# Altium footprint library ref-packages-longpad.PCBLIB: 1527 footprints (part 98 of 103)
Each footprint in its own frame and in the unit in brackets; x right, y up, seen from the top. Pads: shape width x height; smd on the part's side, far side on the other; paste and mask are expansions set on the pad; w line width, h text height; cw(c..) or ccw(c..) is an arc to the next point about the centre after c.
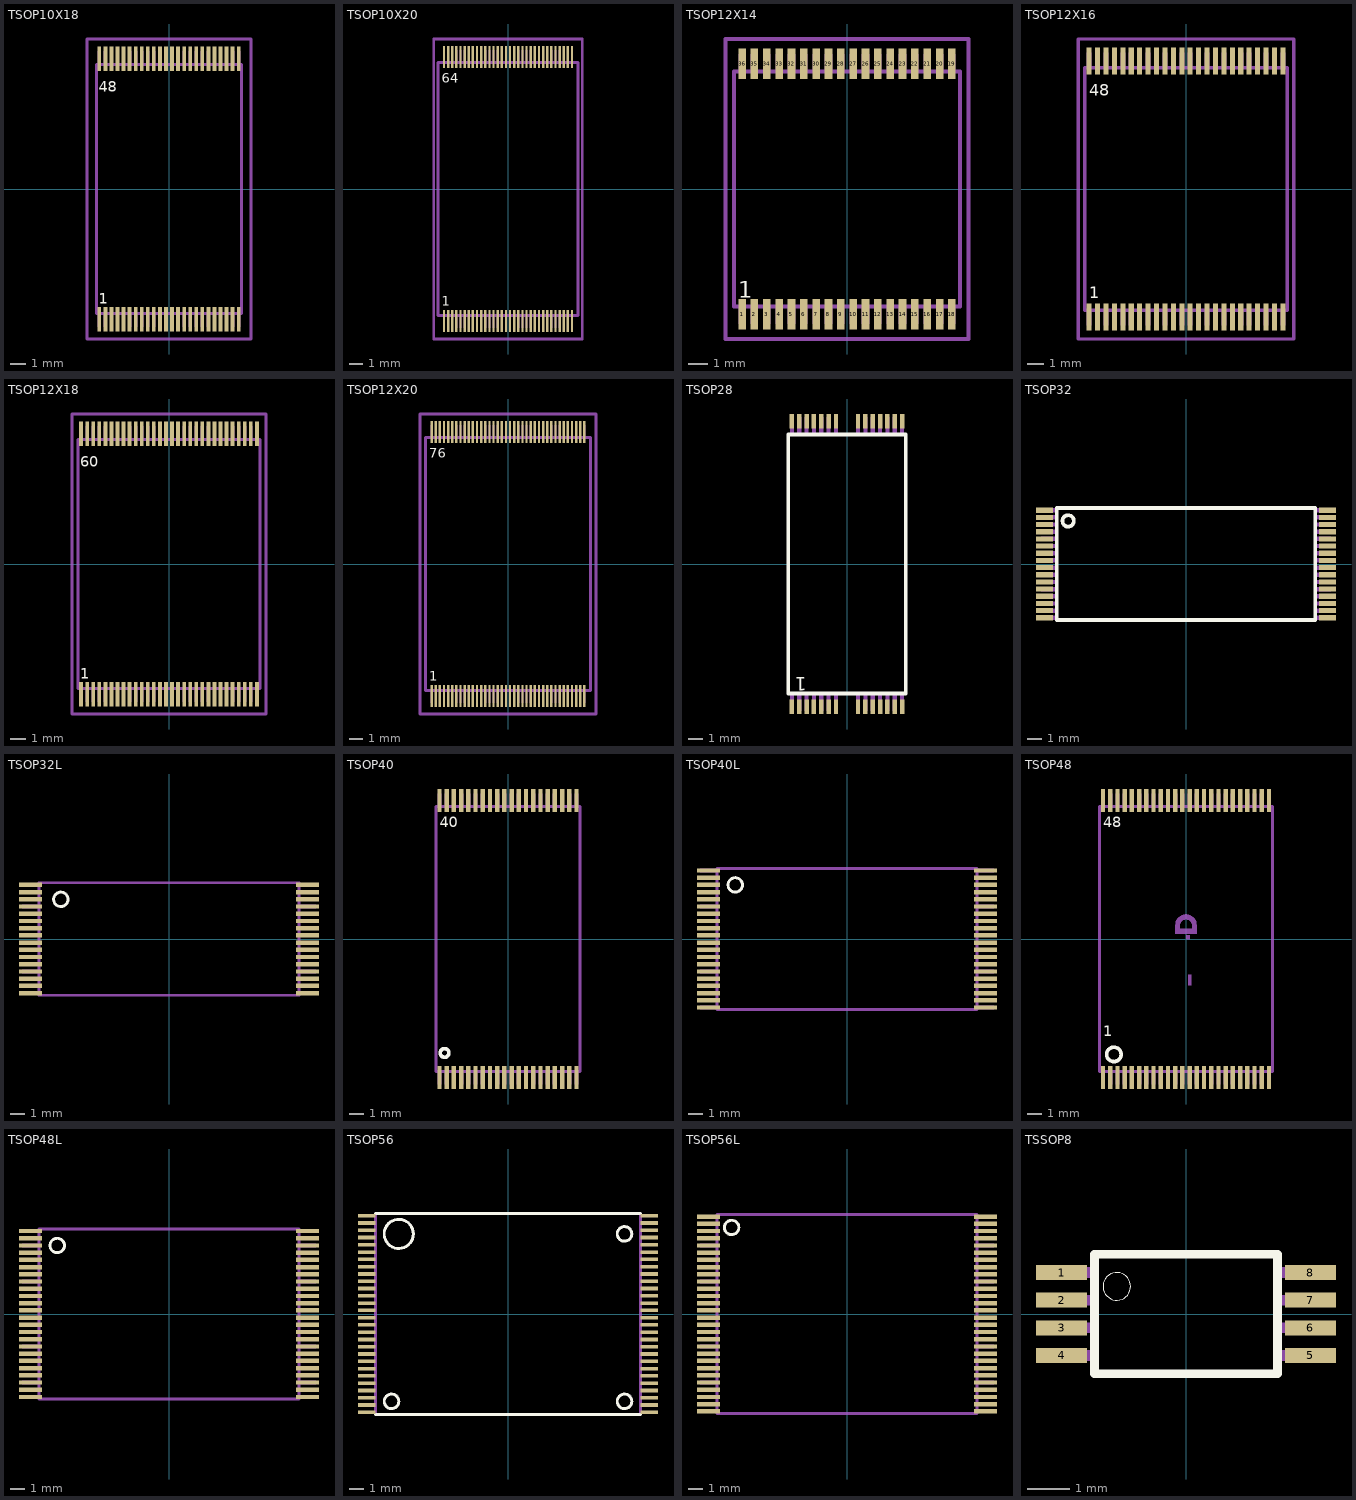
[diagram p97: the footprints below, top view; thin cyan lines are the x and y axes]

## TSOP10X18 [mm]
pads (48):
  rect 0.25x1.6 smd: 1(-4.6,-8.6) 2(-4.2,-8.6) 3(-3.8,-8.6) 4(-3.4,-8.6) 5(-3,-8.6) 6(-2.6,-8.6) 7(-2.2,-8.6) 8(-1.8,-8.6) 9(-1.4,-8.6) 10(-1,-8.6) 11(-0.6,-8.6) 12(-0.2,-8.6) 13(0.2,-8.6) 14(0.6,-8.6) 15(1,-8.6) 16(1.4,-8.6) 17(1.8,-8.6) 18(2.2,-8.6) 19(2.6,-8.6) 20(3,-8.6) 21(3.4,-8.6) 22(3.8,-8.6) 23(4.2,-8.6) 24(4.6,-8.6) 25(4.6,8.6) 26(4.2,8.6) 27(3.8,8.6) 28(3.4,8.6) 29(3,8.6) 30(2.6,8.6) 31(2.2,8.6) 32(1.8,8.6) 33(1.4,8.6) 34(1,8.6) 35(0.6,8.6) 36(0.2,8.6) 37(-0.2,8.6) 38(-0.6,8.6) 39(-1,8.6) 40(-1.4,8.6) 41(-1.8,8.6) 42(-2.2,8.6) 43(-2.6,8.6) 44(-3,8.6) 45(-3.4,8.6) 46(-3.8,8.6) 47(-4.2,8.6) 48(-4.6,8.6)
Top Overlay:
  text "1" at -4.651,-7.57 h0.69
  text "48" at -4.651,6.43 h0.69
Mechanical 16:
  rectangle: -4.71,-9.1 -4.49,-8.27
  rectangle: -4.31,-9.1 -4.09,-8.27
  rectangle: -3.91,-9.1 -3.69,-8.27
  rectangle: -3.51,-9.1 -3.29,-8.27
  rectangle: -3.11,-9.1 -2.89,-8.27
  rectangle: -2.71,-9.1 -2.49,-8.27
  rectangle: -2.31,-9.1 -2.09,-8.27
  rectangle: -1.91,-9.1 -1.69,-8.27
  rectangle: -1.51,-9.1 -1.29,-8.27
  rectangle: -1.11,-9.1 -0.89,-8.27
  rectangle: -0.71,-9.1 -0.49,-8.27
  rectangle: -0.31,-9.1 -0.09,-8.27
  rectangle: 0.09,-9.1 0.31,-8.27
  rectangle: 0.49,-9.1 0.71,-8.27
  rectangle: 0.89,-9.1 1.11,-8.27
  rectangle: 1.29,-9.1 1.51,-8.27
  rectangle: 1.69,-9.1 1.91,-8.27
  rectangle: 2.09,-9.1 2.31,-8.27
  rectangle: 2.49,-9.1 2.71,-8.27
  rectangle: 2.89,-9.1 3.11,-8.27
  rectangle: 3.29,-9.1 3.51,-8.27
  rectangle: 3.69,-9.1 3.91,-8.27
  rectangle: 4.09,-9.1 4.31,-8.27
  rectangle: 4.49,-9.1 4.71,-8.27
  rectangle: 4.49,8.27 4.71,9.1
  rectangle: 4.09,8.27 4.31,9.1
  rectangle: 3.69,8.27 3.91,9.1
  rectangle: 3.29,8.27 3.51,9.1
  rectangle: 2.89,8.27 3.11,9.1
  rectangle: 2.49,8.27 2.71,9.1
  rectangle: 2.09,8.27 2.31,9.1
  rectangle: 1.69,8.27 1.91,9.1
  rectangle: 1.29,8.27 1.51,9.1
  rectangle: 0.89,8.27 1.11,9.1
  rectangle: 0.49,8.27 0.71,9.1
  rectangle: 0.09,8.27 0.31,9.1
  rectangle: -0.31,8.27 -0.09,9.1
  rectangle: -0.71,8.27 -0.49,9.1
  rectangle: -1.11,8.27 -0.89,9.1
  rectangle: -1.51,8.27 -1.29,9.1
  rectangle: -1.91,8.27 -1.69,9.1
  rectangle: -2.31,8.27 -2.09,9.1
  rectangle: -2.71,8.27 -2.49,9.1
  rectangle: -3.11,8.27 -2.89,9.1
  rectangle: -3.51,8.27 -3.29,9.1
  rectangle: -3.91,8.27 -3.69,9.1
  rectangle: -4.31,8.27 -4.09,9.1
  rectangle: -4.71,8.27 -4.49,9.1
  lines w0.203: -4.795,-8.205 4.795,-8.205 4.795,8.205 -4.795,8.205 -4.795,-8.205
Mechanical 27:
  lines w0.2: -5.4,-9.9 -5.4,9.9 5.4,9.9 5.4,-9.9 -5.4,-9.9

## TSOP10X20 [mm]
pads (64):
  rect 0.17x1.6 smd: 1(-4.65,-9.6) 2(-4.35,-9.6) 3(-4.05,-9.6) 4(-3.75,-9.6) 5(-3.45,-9.6) 6(-3.15,-9.6) 7(-2.85,-9.6) 8(-2.55,-9.6) 9(-2.25,-9.6) 10(-1.95,-9.6) 11(-1.65,-9.6) 12(-1.35,-9.6) 13(-1.05,-9.6) 14(-0.75,-9.6) 15(-0.45,-9.6) 16(-0.15,-9.6) 17(0.15,-9.6) 18(0.45,-9.6) 19(0.75,-9.6) 20(1.05,-9.6) 21(1.35,-9.6) 22(1.65,-9.6) 23(1.95,-9.6) 24(2.25,-9.6) 25(2.55,-9.6) 26(2.85,-9.6) 27(3.15,-9.6) 28(3.45,-9.6) 29(3.75,-9.6) 30(4.05,-9.6) 31(4.35,-9.6) 32(4.65,-9.6) 33(4.65,9.6) 34(4.35,9.6) 35(4.05,9.6) 36(3.75,9.6) 37(3.45,9.6) 38(3.15,9.6) 39(2.85,9.6) 40(2.55,9.6) 41(2.25,9.6) 42(1.95,9.6) 43(1.65,9.6) 44(1.35,9.6) 45(1.05,9.6) 46(0.75,9.6) 47(0.45,9.6) 48(0.15,9.6) 49(-0.15,9.6) 50(-0.45,9.6) 51(-0.75,9.6) 52(-1.05,9.6) 53(-1.35,9.6) 54(-1.65,9.6) 55(-1.95,9.6) 56(-2.25,9.6) 57(-2.55,9.6) 58(-2.85,9.6) 59(-3.15,9.6) 60(-3.45,9.6) 61(-3.75,9.6) 62(-4.05,9.6) 63(-4.35,9.6) 64(-4.65,9.6)
Top Overlay:
  text "1" at -4.831,-8.48 h0.69
  text "64" at -4.831,7.72 h0.69
Mechanical 16:
  rectangle: -4.72,-10.1 -4.58,-9.25
  rectangle: -4.42,-10.1 -4.28,-9.25
  rectangle: -4.12,-10.1 -3.98,-9.25
  rectangle: -3.82,-10.1 -3.68,-9.25
  rectangle: -3.52,-10.1 -3.38,-9.25
  rectangle: -3.22,-10.1 -3.08,-9.25
  rectangle: -2.92,-10.1 -2.78,-9.25
  rectangle: -2.62,-10.1 -2.48,-9.25
  rectangle: -2.32,-10.1 -2.18,-9.25
  rectangle: -2.02,-10.1 -1.88,-9.25
  rectangle: -1.72,-10.1 -1.58,-9.25
  rectangle: -1.42,-10.1 -1.28,-9.25
  rectangle: -1.12,-10.1 -0.98,-9.25
  rectangle: -0.82,-10.1 -0.68,-9.25
  rectangle: -0.52,-10.1 -0.38,-9.25
  rectangle: -0.22,-10.1 -0.08,-9.25
  rectangle: 0.08,-10.1 0.22,-9.25
  rectangle: 0.38,-10.1 0.52,-9.25
  rectangle: 0.68,-10.1 0.82,-9.25
  rectangle: 0.98,-10.1 1.12,-9.25
  rectangle: 1.28,-10.1 1.42,-9.25
  rectangle: 1.58,-10.1 1.72,-9.25
  rectangle: 1.88,-10.1 2.02,-9.25
  rectangle: 2.18,-10.1 2.32,-9.25
  rectangle: 2.48,-10.1 2.62,-9.25
  rectangle: 2.78,-10.1 2.92,-9.25
  rectangle: 3.08,-10.1 3.22,-9.25
  rectangle: 3.38,-10.1 3.52,-9.25
  rectangle: 3.68,-10.1 3.82,-9.25
  rectangle: 3.98,-10.1 4.12,-9.25
  rectangle: 4.28,-10.1 4.42,-9.25
  rectangle: 4.58,-10.1 4.72,-9.25
  rectangle: 4.58,9.25 4.72,10.1
  rectangle: 4.28,9.25 4.42,10.1
  rectangle: 3.98,9.25 4.12,10.1
  rectangle: 3.68,9.25 3.82,10.1
  rectangle: 3.38,9.25 3.52,10.1
  rectangle: 3.08,9.25 3.22,10.1
  rectangle: 2.78,9.25 2.92,10.1
  rectangle: 2.48,9.25 2.62,10.1
  rectangle: 2.18,9.25 2.32,10.1
  rectangle: 1.88,9.25 2.02,10.1
  rectangle: 1.58,9.25 1.72,10.1
  rectangle: 1.28,9.25 1.42,10.1
  rectangle: 0.98,9.25 1.12,10.1
  rectangle: 0.68,9.25 0.82,10.1
  rectangle: 0.38,9.25 0.52,10.1
  rectangle: 0.08,9.25 0.22,10.1
  rectangle: -0.22,9.25 -0.08,10.1
  rectangle: -0.52,9.25 -0.38,10.1
  rectangle: -0.82,9.25 -0.68,10.1
  rectangle: -1.12,9.25 -0.98,10.1
  rectangle: -1.42,9.25 -1.28,10.1
  rectangle: -1.72,9.25 -1.58,10.1
  rectangle: -2.02,9.25 -1.88,10.1
  rectangle: -2.32,9.25 -2.18,10.1
  rectangle: -2.62,9.25 -2.48,10.1
  rectangle: -2.92,9.25 -2.78,10.1
  rectangle: -3.22,9.25 -3.08,10.1
  rectangle: -3.52,9.25 -3.38,10.1
  rectangle: -3.82,9.25 -3.68,10.1
  rectangle: -4.12,9.25 -3.98,10.1
  rectangle: -4.42,9.25 -4.28,10.1
  rectangle: -4.72,9.25 -4.58,10.1
  lines w0.203: -5.095,-9.195 5.095,-9.195 5.095,9.195 -5.095,9.195 -5.095,-9.195
Mechanical 27:
  lines w0.2: -5.4,-10.9 -5.4,10.9 5.4,10.9 5.4,-10.9 -5.4,-10.9

## TSOP12X14 [mm]
pads (36):
  rect 0.4x1.6 smd: 1(-5.525,-6.6) 2(-4.875,-6.6) 3(-4.225,-6.6) 4(-3.575,-6.6) 5(-2.925,-6.6) 6(-2.275,-6.6) 7(-1.625,-6.6) 8(-0.975,-6.6) 9(-0.325,-6.6) 10(0.325,-6.6) 11(0.975,-6.6) 12(1.625,-6.6) 13(2.275,-6.6) 14(2.925,-6.6) 15(3.575,-6.6) 16(4.225,-6.6) 17(4.875,-6.6) 18(5.525,-6.6) 19(5.525,6.6) 20(4.875,6.6) 21(4.225,6.6) 22(3.575,6.6) 23(2.925,6.6) 24(2.275,6.6) 25(1.625,6.6) 26(0.975,6.6) 27(0.325,6.6) 28(-0.325,6.6) 29(-0.975,6.6) 30(-1.625,6.6) 31(-2.275,6.6) 32(-2.925,6.6) 33(-3.575,6.6) 34(-4.225,6.6) 35(-4.875,6.6) 36(-5.525,6.6)
Top Overlay:
  text "1" at -5.731,-5.73 h0.86
Mechanical 16:
  rectangle: -5.725,-7.1 -5.325,-6.28
  rectangle: -5.075,-7.1 -4.675,-6.28
  rectangle: -4.425,-7.1 -4.025,-6.28
  rectangle: -3.775,-7.1 -3.375,-6.28
  rectangle: -3.125,-7.1 -2.725,-6.28
  rectangle: -2.475,-7.1 -2.075,-6.28
  rectangle: -1.825,-7.1 -1.425,-6.28
  rectangle: -1.175,-7.1 -0.775,-6.28
  rectangle: -0.525,-7.1 -0.125,-6.28
  rectangle: 0.125,-7.1 0.525,-6.28
  rectangle: 0.775,-7.1 1.175,-6.28
  rectangle: 1.425,-7.1 1.825,-6.28
  rectangle: 2.075,-7.1 2.475,-6.28
  rectangle: 2.725,-7.1 3.125,-6.28
  rectangle: 3.375,-7.1 3.775,-6.28
  rectangle: 4.025,-7.1 4.425,-6.28
  rectangle: 4.675,-7.1 5.075,-6.28
  rectangle: 5.325,-7.1 5.725,-6.28
  rectangle: 5.325,6.28 5.725,7.1
  rectangle: 4.675,6.28 5.075,7.1
  rectangle: 4.025,6.28 4.425,7.1
  rectangle: 3.375,6.28 3.775,7.1
  rectangle: 2.725,6.28 3.125,7.1
  rectangle: 2.075,6.28 2.475,7.1
  rectangle: 1.425,6.28 1.825,7.1
  rectangle: 0.775,6.28 1.175,7.1
  rectangle: 0.125,6.28 0.525,7.1
  rectangle: -0.525,6.28 -0.125,7.1
  rectangle: -1.175,6.28 -0.775,7.1
  rectangle: -1.825,6.28 -1.425,7.1
  rectangle: -2.475,6.28 -2.075,7.1
  rectangle: -3.125,6.28 -2.725,7.1
  rectangle: -3.775,6.28 -3.375,7.1
  rectangle: -4.425,6.28 -4.025,7.1
  rectangle: -5.075,6.28 -4.675,7.1
  rectangle: -5.725,6.28 -5.325,7.1
  lines w0.203: -5.945,-6.195 5.945,-6.195 5.945,6.195 -5.945,6.195 -5.945,-6.195
Mechanical 27:
  lines w0.2: -6.4,-7.9 -6.4,7.9 6.4,7.9 6.4,-7.9 -6.4,-7.9

## TSOP12X16 [mil]
pads (48):
  rect 11.81x62.99 smd: 1(-226.38,-299.21) 2(-206.69,-299.21) 3(-187.01,-299.21) 4(-167.32,-299.21) 5(-147.64,-299.21) 6(-127.95,-299.21) 7(-108.27,-299.21) 8(-88.58,-299.21) 9(-68.9,-299.21) 10(-49.21,-299.21) 11(-29.53,-299.21) 12(-9.84,-299.21) 13(9.84,-299.21) 14(29.53,-299.21) 15(49.21,-299.21) 16(68.9,-299.21) 17(88.58,-299.21) 18(108.27,-299.21) 19(127.95,-299.21) 20(147.64,-299.21) 21(167.32,-299.21) 22(187.01,-299.21) 23(206.69,-299.21) 24(226.38,-299.21) 25(226.38,299.21) 26(206.69,299.21) 27(187.01,299.21) 28(167.32,299.21) 29(147.64,299.21) 30(127.95,299.21) 31(108.27,299.21) 32(88.58,299.21) 33(68.9,299.21) 34(49.21,299.21) 35(29.53,299.21) 36(9.84,299.21) 37(-9.84,299.21) 38(-29.53,299.21) 39(-49.21,299.21) 40(-68.9,299.21) 41(-88.58,299.21) 42(-108.27,299.21) 43(-127.95,299.21) 44(-147.64,299.21) 45(-167.32,299.21) 46(-187.01,299.21) 47(-206.69,299.21) 48(-226.38,299.21)
Top Overlay:
  text "1" at -225.64,-255.12 h27.2
  text "48" at -225.64,217.32 h27.2
Mechanical 16:
  rectangle: -232.28,-318.9 -220.47,-285.43
  rectangle: -212.6,-318.9 -200.79,-285.43
  rectangle: -192.91,-318.9 -181.1,-285.43
  rectangle: -173.23,-318.9 -161.42,-285.43
  rectangle: -153.54,-318.9 -141.73,-285.43
  rectangle: -133.86,-318.9 -122.05,-285.43
  rectangle: -114.17,-318.9 -102.36,-285.43
  rectangle: -94.49,-318.9 -82.68,-285.43
  rectangle: -74.8,-318.9 -62.99,-285.43
  rectangle: -55.12,-318.9 -43.31,-285.43
  rectangle: -35.43,-318.9 -23.62,-285.43
  rectangle: -15.75,-318.9 -3.94,-285.43
  rectangle: 3.94,-318.9 15.75,-285.43
  rectangle: 23.62,-318.9 35.43,-285.43
  rectangle: 43.31,-318.9 55.12,-285.43
  rectangle: 62.99,-318.9 74.8,-285.43
  rectangle: 82.68,-318.9 94.49,-285.43
  rectangle: 102.36,-318.9 114.17,-285.43
  rectangle: 122.05,-318.9 133.86,-285.43
  rectangle: 141.73,-318.9 153.54,-285.43
  rectangle: 161.42,-318.9 173.23,-285.43
  rectangle: 181.1,-318.9 192.91,-285.43
  rectangle: 200.79,-318.9 212.6,-285.43
  rectangle: 220.47,-318.9 232.28,-285.43
  rectangle: 220.47,285.43 232.28,318.9
  rectangle: 200.79,285.43 212.6,318.9
  rectangle: 181.1,285.43 192.91,318.9
  rectangle: 161.42,285.43 173.23,318.9
  rectangle: 141.73,285.43 153.54,318.9
  rectangle: 122.05,285.43 133.86,318.9
  rectangle: 102.36,285.43 114.17,318.9
  rectangle: 82.68,285.43 94.49,318.9
  rectangle: 62.99,285.43 74.8,318.9
  rectangle: 43.31,285.43 55.12,318.9
  rectangle: 23.62,285.43 35.43,318.9
  rectangle: 3.94,285.43 15.75,318.9
  rectangle: -15.75,285.43 -3.94,318.9
  rectangle: -35.43,285.43 -23.62,318.9
  rectangle: -55.12,285.43 -43.31,318.9
  rectangle: -74.8,285.43 -62.99,318.9
  rectangle: -94.49,285.43 -82.68,318.9
  rectangle: -114.17,285.43 -102.36,318.9
  rectangle: -133.86,285.43 -122.05,318.9
  rectangle: -153.54,285.43 -141.73,318.9
  rectangle: -173.23,285.43 -161.42,318.9
  rectangle: -192.91,285.43 -181.1,318.9
  rectangle: -212.6,285.43 -200.79,318.9
  rectangle: -232.28,285.43 -220.47,318.9
  lines w8: -236.02,-283.27 236.02,-283.27 236.02,283.27 -236.02,283.27 -236.02,-283.27
Mechanical 27:
  lines w7.87: -251.97,-350.39 -251.97,350.39 251.97,350.39 251.97,-350.39 -251.97,-350.39

## TSOP12X18 [mm]
pads (60):
  rect 0.25x1.6 smd: 1(-5.8,-8.6) 2(-5.4,-8.6) 3(-5,-8.6) 4(-4.6,-8.6) 5(-4.2,-8.6) 6(-3.8,-8.6) 7(-3.4,-8.6) 8(-3,-8.6) 9(-2.6,-8.6) 10(-2.2,-8.6) 11(-1.8,-8.6) 12(-1.4,-8.6) 13(-1,-8.6) 14(-0.6,-8.6) 15(-0.2,-8.6) 16(0.2,-8.6) 17(0.6,-8.6) 18(1,-8.6) 19(1.4,-8.6) 20(1.8,-8.6) 21(2.2,-8.6) 22(2.6,-8.6) 23(3,-8.6) 24(3.4,-8.6) 25(3.8,-8.6) 26(4.2,-8.6) 27(4.6,-8.6) 28(5,-8.6) 29(5.4,-8.6) 30(5.8,-8.6) 31(5.8,8.6) 32(5.4,8.6) 33(5,8.6) 34(4.6,8.6) 35(4.2,8.6) 36(3.8,8.6) 37(3.4,8.6) 38(3,8.6) 39(2.6,8.6) 40(2.2,8.6) 41(1.8,8.6) 42(1.4,8.6) 43(1,8.6) 44(0.6,8.6) 45(0.2,8.6) 46(-0.2,8.6) 47(-0.6,8.6) 48(-1,8.6) 49(-1.4,8.6) 50(-1.8,8.6) 51(-2.2,8.6) 52(-2.6,8.6) 53(-3,8.6) 54(-3.4,8.6) 55(-3.8,8.6) 56(-4.2,8.6) 57(-4.6,8.6) 58(-5,8.6) 59(-5.4,8.6) 60(-5.8,8.6)
Top Overlay:
  text "1" at -5.851,-7.57 h0.69
  text "60" at -5.851,6.43 h0.69
Mechanical 16:
  rectangle: -5.91,-9.1 -5.69,-8.27
  rectangle: -5.51,-9.1 -5.29,-8.27
  rectangle: -5.11,-9.1 -4.89,-8.27
  rectangle: -4.71,-9.1 -4.49,-8.27
  rectangle: -4.31,-9.1 -4.09,-8.27
  rectangle: -3.91,-9.1 -3.69,-8.27
  rectangle: -3.51,-9.1 -3.29,-8.27
  rectangle: -3.11,-9.1 -2.89,-8.27
  rectangle: -2.71,-9.1 -2.49,-8.27
  rectangle: -2.31,-9.1 -2.09,-8.27
  rectangle: -1.91,-9.1 -1.69,-8.27
  rectangle: -1.51,-9.1 -1.29,-8.27
  rectangle: -1.11,-9.1 -0.89,-8.27
  rectangle: -0.71,-9.1 -0.49,-8.27
  rectangle: -0.31,-9.1 -0.09,-8.27
  rectangle: 0.09,-9.1 0.31,-8.27
  rectangle: 0.49,-9.1 0.71,-8.27
  rectangle: 0.89,-9.1 1.11,-8.27
  rectangle: 1.29,-9.1 1.51,-8.27
  rectangle: 1.69,-9.1 1.91,-8.27
  rectangle: 2.09,-9.1 2.31,-8.27
  rectangle: 2.49,-9.1 2.71,-8.27
  rectangle: 2.89,-9.1 3.11,-8.27
  rectangle: 3.29,-9.1 3.51,-8.27
  rectangle: 3.69,-9.1 3.91,-8.27
  rectangle: 4.09,-9.1 4.31,-8.27
  rectangle: 4.49,-9.1 4.71,-8.27
  rectangle: 4.89,-9.1 5.11,-8.27
  rectangle: 5.29,-9.1 5.51,-8.27
  rectangle: 5.69,-9.1 5.91,-8.27
  rectangle: 5.69,8.27 5.91,9.1
  rectangle: 5.29,8.27 5.51,9.1
  rectangle: 4.89,8.27 5.11,9.1
  rectangle: 4.49,8.27 4.71,9.1
  rectangle: 4.09,8.27 4.31,9.1
  rectangle: 3.69,8.27 3.91,9.1
  rectangle: 3.29,8.27 3.51,9.1
  rectangle: 2.89,8.27 3.11,9.1
  rectangle: 2.49,8.27 2.71,9.1
  rectangle: 2.09,8.27 2.31,9.1
  rectangle: 1.69,8.27 1.91,9.1
  rectangle: 1.29,8.27 1.51,9.1
  rectangle: 0.89,8.27 1.11,9.1
  rectangle: 0.49,8.27 0.71,9.1
  rectangle: 0.09,8.27 0.31,9.1
  rectangle: -0.31,8.27 -0.09,9.1
  rectangle: -0.71,8.27 -0.49,9.1
  rectangle: -1.11,8.27 -0.89,9.1
  rectangle: -1.51,8.27 -1.29,9.1
  rectangle: -1.91,8.27 -1.69,9.1
  rectangle: -2.31,8.27 -2.09,9.1
  rectangle: -2.71,8.27 -2.49,9.1
  rectangle: -3.11,8.27 -2.89,9.1
  rectangle: -3.51,8.27 -3.29,9.1
  rectangle: -3.91,8.27 -3.69,9.1
  rectangle: -4.31,8.27 -4.09,9.1
  rectangle: -4.71,8.27 -4.49,9.1
  rectangle: -5.11,8.27 -4.89,9.1
  rectangle: -5.51,8.27 -5.29,9.1
  rectangle: -5.91,8.27 -5.69,9.1
  lines w0.203: -5.995,-8.205 5.995,-8.205 5.995,8.205 -5.995,8.205 -5.995,-8.205
Mechanical 27:
  lines w0.2: -6.4,-9.9 -6.4,9.9 6.4,9.9 6.4,-9.9 -6.4,-9.9

## TSOP12X20 [mm]
pads (76):
  rect 0.17x1.6 smd: 1(-5.55,-9.6) 2(-5.25,-9.6) 3(-4.95,-9.6) 4(-4.65,-9.6) 5(-4.35,-9.6) 6(-4.05,-9.6) 7(-3.75,-9.6) 8(-3.45,-9.6) 9(-3.15,-9.6) 10(-2.85,-9.6) 11(-2.55,-9.6) 12(-2.25,-9.6) 13(-1.95,-9.6) 14(-1.65,-9.6) 15(-1.35,-9.6) 16(-1.05,-9.6) 17(-0.75,-9.6) 18(-0.45,-9.6) 19(-0.15,-9.6) 20(0.15,-9.6) 21(0.45,-9.6) 22(0.75,-9.6) 23(1.05,-9.6) 24(1.35,-9.6) 25(1.65,-9.6) 26(1.95,-9.6) 27(2.25,-9.6) 28(2.55,-9.6) 29(2.85,-9.6) 30(3.15,-9.6) 31(3.45,-9.6) 32(3.75,-9.6) 33(4.05,-9.6) 34(4.35,-9.6) 35(4.65,-9.6) 36(4.95,-9.6) 37(5.25,-9.6) 38(5.55,-9.6) 39(5.55,9.6) 40(5.25,9.6) 41(4.95,9.6) 42(4.65,9.6) 43(4.35,9.6) 44(4.05,9.6) 45(3.75,9.6) 46(3.45,9.6) 47(3.15,9.6) 48(2.85,9.6) 49(2.55,9.6) 50(2.25,9.6) 51(1.95,9.6) 52(1.65,9.6) 53(1.35,9.6) 54(1.05,9.6) 55(0.75,9.6) 56(0.45,9.6) 57(0.15,9.6) 58(-0.15,9.6) 59(-0.45,9.6) 60(-0.75,9.6) 61(-1.05,9.6) 62(-1.35,9.6) 63(-1.65,9.6) 64(-1.95,9.6) 65(-2.25,9.6) 66(-2.55,9.6) 67(-2.85,9.6) 68(-3.15,9.6) 69(-3.45,9.6) 70(-3.75,9.6) 71(-4.05,9.6) 72(-4.35,9.6) 73(-4.65,9.6) 74(-4.95,9.6) 75(-5.25,9.6) 76(-5.55,9.6)
Top Overlay:
  text "1" at -5.731,-8.48 h0.69
  text "76" at -5.731,7.72 h0.69
Mechanical 16:
  rectangle: -5.62,-10.1 -5.48,-9.25
  rectangle: -5.32,-10.1 -5.18,-9.25
  rectangle: -5.02,-10.1 -4.88,-9.25
  rectangle: -4.72,-10.1 -4.58,-9.25
  rectangle: -4.42,-10.1 -4.28,-9.25
  rectangle: -4.12,-10.1 -3.98,-9.25
  rectangle: -3.82,-10.1 -3.68,-9.25
  rectangle: -3.52,-10.1 -3.38,-9.25
  rectangle: -3.22,-10.1 -3.08,-9.25
  rectangle: -2.92,-10.1 -2.78,-9.25
  rectangle: -2.62,-10.1 -2.48,-9.25
  rectangle: -2.32,-10.1 -2.18,-9.25
  rectangle: -2.02,-10.1 -1.88,-9.25
  rectangle: -1.72,-10.1 -1.58,-9.25
  rectangle: -1.42,-10.1 -1.28,-9.25
  rectangle: -1.12,-10.1 -0.98,-9.25
  rectangle: -0.82,-10.1 -0.68,-9.25
  rectangle: -0.52,-10.1 -0.38,-9.25
  rectangle: -0.22,-10.1 -0.08,-9.25
  rectangle: 0.08,-10.1 0.22,-9.25
  rectangle: 0.38,-10.1 0.52,-9.25
  rectangle: 0.68,-10.1 0.82,-9.25
  rectangle: 0.98,-10.1 1.12,-9.25
  rectangle: 1.28,-10.1 1.42,-9.25
  rectangle: 1.58,-10.1 1.72,-9.25
  rectangle: 1.88,-10.1 2.02,-9.25
  rectangle: 2.18,-10.1 2.32,-9.25
  rectangle: 2.48,-10.1 2.62,-9.25
  rectangle: 2.78,-10.1 2.92,-9.25
  rectangle: 3.08,-10.1 3.22,-9.25
  rectangle: 3.38,-10.1 3.52,-9.25
  rectangle: 3.68,-10.1 3.82,-9.25
  rectangle: 3.98,-10.1 4.12,-9.25
  rectangle: 4.28,-10.1 4.42,-9.25
  rectangle: 4.58,-10.1 4.72,-9.25
  rectangle: 4.88,-10.1 5.02,-9.25
  rectangle: 5.18,-10.1 5.32,-9.25
  rectangle: 5.48,-10.1 5.62,-9.25
  rectangle: 5.48,9.25 5.62,10.1
  rectangle: 5.18,9.25 5.32,10.1
  rectangle: 4.88,9.25 5.02,10.1
  rectangle: 4.58,9.25 4.72,10.1
  rectangle: 4.28,9.25 4.42,10.1
  rectangle: 3.98,9.25 4.12,10.1
  rectangle: 3.68,9.25 3.82,10.1
  rectangle: 3.38,9.25 3.52,10.1
  rectangle: 3.08,9.25 3.22,10.1
  rectangle: 2.78,9.25 2.92,10.1
  rectangle: 2.48,9.25 2.62,10.1
  rectangle: 2.18,9.25 2.32,10.1
  rectangle: 1.88,9.25 2.02,10.1
  rectangle: 1.58,9.25 1.72,10.1
  rectangle: 1.28,9.25 1.42,10.1
  rectangle: 0.98,9.25 1.12,10.1
  rectangle: 0.68,9.25 0.82,10.1
  rectangle: 0.38,9.25 0.52,10.1
  rectangle: 0.08,9.25 0.22,10.1
  rectangle: -0.22,9.25 -0.08,10.1
  rectangle: -0.52,9.25 -0.38,10.1
  rectangle: -0.82,9.25 -0.68,10.1
  rectangle: -1.12,9.25 -0.98,10.1
  rectangle: -1.42,9.25 -1.28,10.1
  rectangle: -1.72,9.25 -1.58,10.1
  rectangle: -2.02,9.25 -1.88,10.1
  rectangle: -2.32,9.25 -2.18,10.1
  rectangle: -2.62,9.25 -2.48,10.1
  rectangle: -2.92,9.25 -2.78,10.1
  rectangle: -3.22,9.25 -3.08,10.1
  rectangle: -3.52,9.25 -3.38,10.1
  rectangle: -3.82,9.25 -3.68,10.1
  rectangle: -4.12,9.25 -3.98,10.1
  rectangle: -4.42,9.25 -4.28,10.1
  rectangle: -4.72,9.25 -4.58,10.1
  rectangle: -5.02,9.25 -4.88,10.1
  rectangle: -5.32,9.25 -5.18,10.1
  rectangle: -5.62,9.25 -5.48,10.1
  lines w0.203: -5.995,-9.195 5.995,-9.195 5.995,9.195 -5.995,9.195 -5.995,-9.195
Mechanical 27:
  lines w0.2: -6.4,-10.9 -6.4,10.9 6.4,10.9 6.4,-10.9 -6.4,-10.9
